# Altium integrated library MOTHER_BOARD_LS1021_v1.0.IntLib: 147 symbols (continued)
## LS1021A (continued)
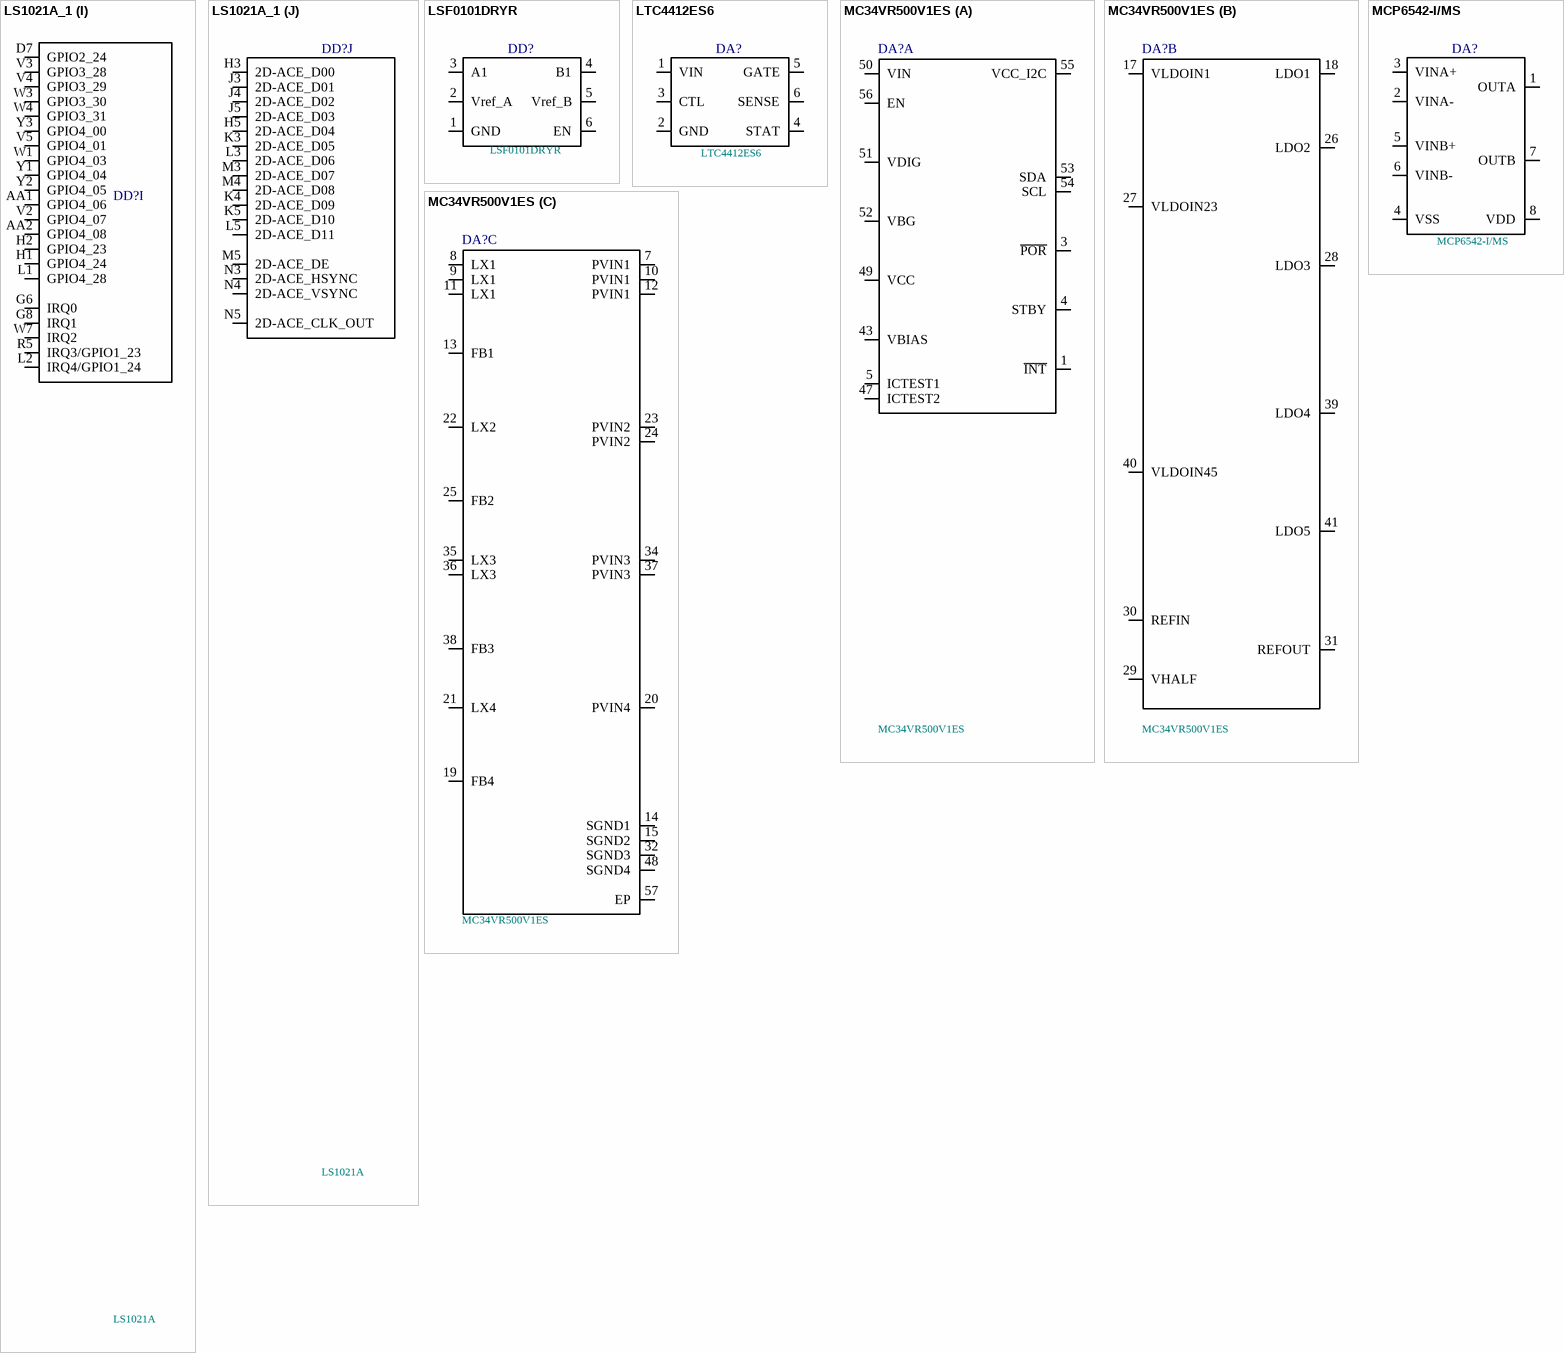
[diagram p6: symbols LS1021A_1 to MCP6542-I/MS]

## LS1021A_1
designator DD?, comment LS1021A
Микросхема LS1021AXE7KQB; Manufactory: NXP Semiconductor; Function: QorIQ® Layerscape 1021A Dual-Core Communications Processor with LCD Controller
footprint BGA525
part A pins: A19 DDR_ECC1, A20 #DDR_MDQS8, A21 DDR_MDQS8, AA18 DDR_A12, AA19 DDR_A10, AA20 DDR_A4, AA21 DDR_BA1, AA22 DDR_CK0, AA23 #DDR_CK0, AB19 DDR_BA2, AB21 DDR_A6, AC18 #DDR_RAS, AC19 DDR_A14, AC20 DDR_A3, AC21 DDR_BA0, AC22 DDR_A0, B19 DDR_ECC0, B21 DDR_DM8, B22 DDR_ECC3, B23 DDR_DQ20, C20 DDR_DQ28, C21 DDR_ECC2, C23 DDR_DQ16, D19 DDR_DQ24, D21 DDR_DQ29, D22 DDR_DQ21, D23 DDR_DQ17, E20 DDR_DQ25, E21 DDR_DM3, E23 DDR_DM2, F21 #DDR_MDQS3, F22 #DDR_MDQS2, F23 DDR_MDQS2, G20 DDR_DQ30, G21 DDR_MDQS3, G23 DDR_DQ22, H18 DDR_CLK, H21 DDR_DQ26, H22 DDR_DQ18, H23 DDR_DQ23, J20 DDR_DQ31, J21 DDR_DQ27, J23 DDR_DQ19, K19 DDR_DQ12, K21 DDR_DQ8, K22 DDR_DQ4, K23 DDR_DQ0, L17 DDR_MVREF, L19 DDR_DQ13, L20 DDR_DM1, L21 DDR_DQ9, L23 DDR_DQ5, M19 DDR_MDQS1, M20 #DDR_MDQS1, M22 DDR_DQ1, M23 DDR_DM0, N17 DDR_TPA, N19 DDR_DQ15, N20 DDR_DQ14, N21 DDR_DQ10, N22 #DDR_MDQS0, N23 DDR_MDQS0, P21 DDR_DQ11, P23 DDR_DQ6, R18 DDR_A15, R19 DDR_ODT1, R20 DDR_ODT0, R22 DDR_DQ7, R23 DDR_DQ2, T18 #DDR_CS1, T20 DDR_A8, T21 DDR_A13, T23 DDR_DQ3, U17 #DDR_CS3, U18 DDR_CKE1, U19 #DDR_CS0, U20 DDR_A7, U21 DDR_A11, U22 DDR_APAR_OUT, V17 #DDR_CS2, V19 DDR_CKE0, V21 DDR_A2, V23 DDR_DIC0, W18 #DDR_CAS, W19 #DDR_WE, W20 DDR_A5, W21 #DDR_APAR_ERR, W22 DDR_CK1, W23 #DDR_CK1, Y19 DDR_A1, Y21 DDR_A9, Y23 DDR_DIC1
part B pins: AA4 EC1_GTX_CLK125, AA5 EC1_TXD2, AA6 EC1_TXD0, AB2 MDC, AB3 MDIO, AB4 EC1_RXD3, AB6 EC1_RXD0, AC3 EC1_RX_CLK, AC4 EC1_RXD2, AC5 EC1_RXD1, AC6 EC1_RX_DV, W5 EC1_TXD3, W6 EC1_TX_EN, Y6 EC1_TXD1, Y7 EC1_GTX_CLK
part C pins: A3 GND, A5 GND, A18 GND, A22 GND, AA3 GND, AA7 S1GND, AA8 S1GND, AA9 S1GND, AA10 S1GND, AA11 S1GND, AA12 S1GND, AA13 S1GND, AA14 S1GND, AA15 S1GND, AA16 S1GND, AA17 S1GND, AB1 GND, AB5 GND, AB7 S1GND, AB9 S1GND, AB12 S1GND, AB15 S1GND, AB17 S1GND, AC2 GND, AC7 S1GND, AC9 S1GND, AC12 S1GND, AC15 S1GND, AC17 S1GND, B1 GND, B3 GND, B5 GND, B7 GND, B10 GND, B13 GND, B16 GND, B18 GND, B20 GND, C2 GND, C4 GND, C19 GND, C22 GND, D2 GND, D6 GND, D18 GND, D20 GND, E4 GND, E9 GND, E12 GND, E15 GND, E19 GND, E22 GND, F17 GND, F20 GND, G2 GND, G7 GND, G19 GND, G22 GND, H4 GND, H6 GND, H8 GND, H9 GND, H10 GND, H11 GND, H12 GND, H13 GND, H14 GND, H15 GND, H17 GND, H20 GND, J16 GND, J18 GND, J19 GND, J22 GND, K2 GND, K7 GND, K9 GND, K10 GND, K13 GND, K16 GND, K18 GND, K20 GND, L4 GND, L7 GND, L10 GND, L12 GND, L14 GND, L16 GND, L18 GND, L22 GND, M7 GND, M9 GND, M11 GND, M13 GND, M16 GND, M17 GND, M18 GND, M21 GND, N2 GND, N7 GND, N10 GND, N12 GND, N14 GND, N16 GND, N18 GND, P4 GND, P7 GND, P9 GND, P11 GND, P13 GND, P16 GND, P18 GND, P20 GND, P22 GND, R7 GND, R10 GND, R14 GND, R16 GND, R17 GND, T2 GND, T7 GND, T9 S1GND, T11 S1GND, T12 S1GND, T13 S1GND, T15 S1GND, T16 GND, T22 GND, U4 GND, U8 GND, U12 S1GND, U23 GND, V6 GND, V10 X1GND, V11 X1GND, V13 X1GND, V14 X1GND, W2 GND, W9 X1GND, W12 X1GND, W15 X1GND, Y5 GND, Y9 X1GND, Y12 X1GND, Y15 X1GND, Y17 GND
part D pins: AB18 G1VDD, AB20 G1VDD, AB22 G1VDD, D4 USB_HVDD, F10 PROG_MTR, F11 TA_PROG_SFP, G10 AVDD_PLAT, G11 AVDD_CGA1, G12 FA_VL, G15 TH_VDD, G16 SENSEGND, H7 USB1_SDVDD, H16 SENSEVDD, J8 USB1_SXVDD, J9 USB1_SPVDD, J10 O1VDD, J11 O1VDD, J12 OVDD, J13 BVDD, J14 BVDD, J15 BVDD, K8 EVDD, K11 VDDC, K12 VDD, K14 VDD, K15 G1VDD, K17 AVDD_D1, L8 DVDD, L9 DVDD, L11 VDD, L13 VDD, L15 G1VDD, M8 D1VDD, M10 VDDC, M12 VDD, M14 VDD, M15 G1VDD, N8 LVDD, N9 VDD, N11 VDD, N13 VDD, N15 G1VDD, P8 LVDD, P10 VDDC, P12 VDD, P14 VDD, P15 G1VDD, P17 G1VDD, P19 G1VDD, R8 L1VDD, R9 VDDC, R11 S1VDD, R12 S1VDD, R13 S1VDD, R15 G1VDD, R21 G1VDD, T6 TA_BB_VDD, T8 L1VDD, T17 G1VDD, T19 G1VDD, U7 SENSEGNDC, U10 AGND_SD1_PLL1, U11 AVDD_SD1_PLL1, U13 AGND_SD1_PLL2, U14 AVDD_SD1_PLL2, V8 SENSEVDDC, V9 X1VDD, V12 X1VDD, V15 X1VDD, V18 G1VDD, V20 G1VDD, V22 G1VDD, Y8 X1VDD, Y18 G1VDD, Y20 G1VDD, Y22 G1VDD
part E pins: A6 EVT2, AB8 SD1_REF_CLK1_N, AB16 SD1_REF_CLK2_N, AC8 SD1_REF_CLK1_P, AC16 SD1_REF_CLK2_P, B6 EVT3, C5 EVT0, C6 CLK_OUT, C7 EVT4, D5 EVT1, E5 HRESET_B, E6 ASLEEP, E7 TDI, E8 TCK, E10 RTC, E11 ~{CKSTP_OUT}, F3 TEST_SEL_B, F4 DIFF_SYSCLK, F5 SYSCLK, F6 ~{TRST}, F7 TDO, F8 TMS, F9 TA_TMP_DETECT_B, F12 FA_ANALOG_PIN, G3 SCAN_MODE_B, G4 nDIFF_SYSCLK, G5 RESET_REQ_B, G9 PORESET_B, G13 FA_ANALOG_G_V, G17 TH_TPA, J6 TD1_ANODE, K6 TD1_CATHODE, R6 TA_BB_RTC, U6 TA_BB_TMP_DETECT_B
part F pins: A2 USB1_TX_M, A4 USB1_RX_M, B2 USB1_TX_P, B4 USB1_RX_P, C1 USB1_VBUS, C3 USB1_D_M, D3 USB1_D_P, E3 USB1_ID, J1 USB1_PWRFAULT, J2 USB1_DRVVBUS, J7 USB1_RESREF, M1 UART1_SIN, M2 IRQ5, N1 UART1_SOUT, N6 I2C1_SCL, P1 UART2_SOUT, P2 UART2_SIN, P3 UART4_SOUT, P5 UART4_SIN, P6 I2C1_SDA, R1 USB2_DIR, R2 USB2_D3, R3 USB2_D6, R4 USB2_D7, T1 USB2_D2, T3 USB2_D4, T4 USB2_D5, T5 USB2_STP, U1 USB2_D1, U2 USB2_D0, U3 USB2_CLK, U5 USB2_PWRFAULT, V1 USB2_NXT, Y4 USB2_DRVVBUS
part G pins: A7 IFC_AD0, A8 IFC_AD2, A9 IFC_AD4, A10 IFC_AD5, A11 IFC_AD7, A12 IFC_AD9, A13 IFC_AD10, A14 IFC_AD12, A15 IFC_AD14, A16 IFC_AD15, A17 IFC_CLK0, B8 IFC_AD1, B9 IFC_AD3, B11 IFC_AD6, B12 IFC_AD8, B14 IFC_AD11, B15 IFC_AD13, B17 IFC_CLK1, C8 IFC_A16, C9 IFC_A18, C10 IFC_A20, C11 IFC_A22, C12 IFC_A24, C13 IFC_A26, C14 IFC_NDDDR_CLK, C15 ~{IFC_PERR}, C16 IFC_AVD, C17 ~{IFC_CS0}, C18 ~{IFC_CS2}, D1 SDHC_CLK, D8 IFC_A17, D9 IFC_A19, D10 IFC_A21, D11 IFC_A23, D12 IFC_A25, D13 IFC_A27, D14 IFC_TE, D15 IFC_PAR0, D16 IFC_NDDQS, D17 ~{IFC_CS1}, E1 SDHC_DAT0, E2 SDHC_CMD, E13 IFC_PAR1, E14 IFC_BCTL, E16 ~{IFC_OE}, E17 IFC_CLE, E18 ~{IFC_WP0}, F1 SDHC_DAT2, F2 SDHC_DAT1, F14 ~{IFC_WE0}, F15 ~{IFC_RB1}, F16 ~{IFC_RB0}, F18 ~{IFC_CS3}, G1 SDHC_DAT3, K1 SDHC_CD
part H pins: AB10 SD1_RX0_N, AB11 SD1_RX1_N, AB13 SD1_RX2_N, AB14 SD1_RX3_N, AC10 SD1_RX0_P, AC11 SD1_RX1_P, AC13 SD1_RX2_P, AC14 SD1_RX3_P, T10 SD1_PLL1_TPA, T14 SD1_IMP_CAL_TX, U9 SD1_IMP_CAL_RX, U15 SD1_PLL2_TPA, W8 SD1_PLL1_TPD, W10 SD1_TX0_P, W11 SD1_TX1_P, W13 SD1_TX2_P, W14 SD1_TX3_P, Y10 SD1_TX0_N, Y11 SD1_TX1_N, Y13 SD1_TX2_N, Y14 SD1_TX3_N, Y16 SD1_PLL2_TPD
part I pins: AA1 GPIO4_06, AA2 GPIO4_08, D7 GPIO2_24, G6 IRQ0, G8 IRQ1, H1 GPIO4_24, H2 GPIO4_23, L1 GPIO4_28, L2 IRQ4/GPIO1_24, R5 IRQ3/GPIO1_23, V2 GPIO4_07, V3 GPIO3_28, V4 GPIO3_29, V5 GPIO4_01, W1 GPIO4_03, W3 GPIO3_30, W4 GPIO3_31, W7 IRQ2, Y1 GPIO4_04, Y2 GPIO4_05, Y3 GPIO4_00
part J pins: H3 2D-ACE_D00, H5 2D-ACE_D04, J3 2D-ACE_D01, J4 2D-ACE_D02, J5 2D-ACE_D03, K3 2D-ACE_D05, K4 2D-ACE_D09, K5 2D-ACE_D10, L3 2D-ACE_D06, L5 2D-ACE_D11, M3 2D-ACE_D07, M4 2D-ACE_D08, M5 2D-ACE_DE, N3 2D-ACE_HSYNC, N4 2D-ACE_VSYNC, N5 2D-ACE_CLK_OUT

## LSF0101DRYR
designator DD?
Микросхема LSF0101DRYR; Manufactory: Texas Instruments; Function: Single bi-directional multi-voltage level translator
footprint SON-6 (Footprint not found)
pins: 1 GND, 2 Vref_A, 3 A1, 4 B1, 5 Vref_B, 6 EN

## LTC4412ES6
designator DA?
Микросхема LTC4412ES6; Manufactory: Analog Devices; Function: Low Loss PowerPath Controller
footprint SOT-23-6
pins: 1 VIN, 2 GND, 3 CTL, 4 STAT, 5 GATE, 6 SENSE

## MC34VR500V1ES
designator DA?
Микросхема MC34VR500V1ES; Manufactory: NXP Semiconductors; Function: Multi-output DC/DC regulator for  QorIQ LS1/T1 family
footprint QFN-56 (QFN, 56-Leads, Body 8,00x8,00mm, Pitch 0,50mm, Thermal Pad 5,90x5,90mm, IPC Medium Density)
part A pins: 1 ~{INT}, 3 ~{POR}, 4 STBY, 5 ICTEST1, 43 VBIAS, 47 ICTEST2, 49 VCC, 50 VIN, 51 VDIG, 52 VBG, 53 SDA, 54 SCL, 55 VCC_I2C, 56 EN
part B pins: 17 VLDOIN1, 18 LDO1, 26 LDO2, 27 VLDOIN23, 28 LDO3, 29 VHALF, 30 REFIN, 31 REFOUT, 39 LDO4, 40 VLDOIN45, 41 LDO5
part C pins: 7 PVIN1, 8 LX1, 9 LX1, 10 PVIN1, 11 LX1, 12 PVIN1, 13 FB1, 14 SGND1, 15 SGND2, 19 FB4, 20 PVIN4, 21 LX4, 22 LX2, 23 PVIN2, 24 PVIN2, 25 FB2, 32 SGND3, 34 PVIN3, 35 LX3, 36 LX3, 37 PVIN3, 38 FB3, 48 SGND4, 57 EP

## MCP6542-I/MS
designator DA?
Микросхема MCP6542-I/MS; Manufactory: Microchip Technology; Function: Dual channels comparator
footprint SOIC8
pins: 1 OUTA, 2 VINA-, 3 VINA+, 4 VSS, 5 VINB+, 6 VINB-, 7 OUTB, 8 VDD

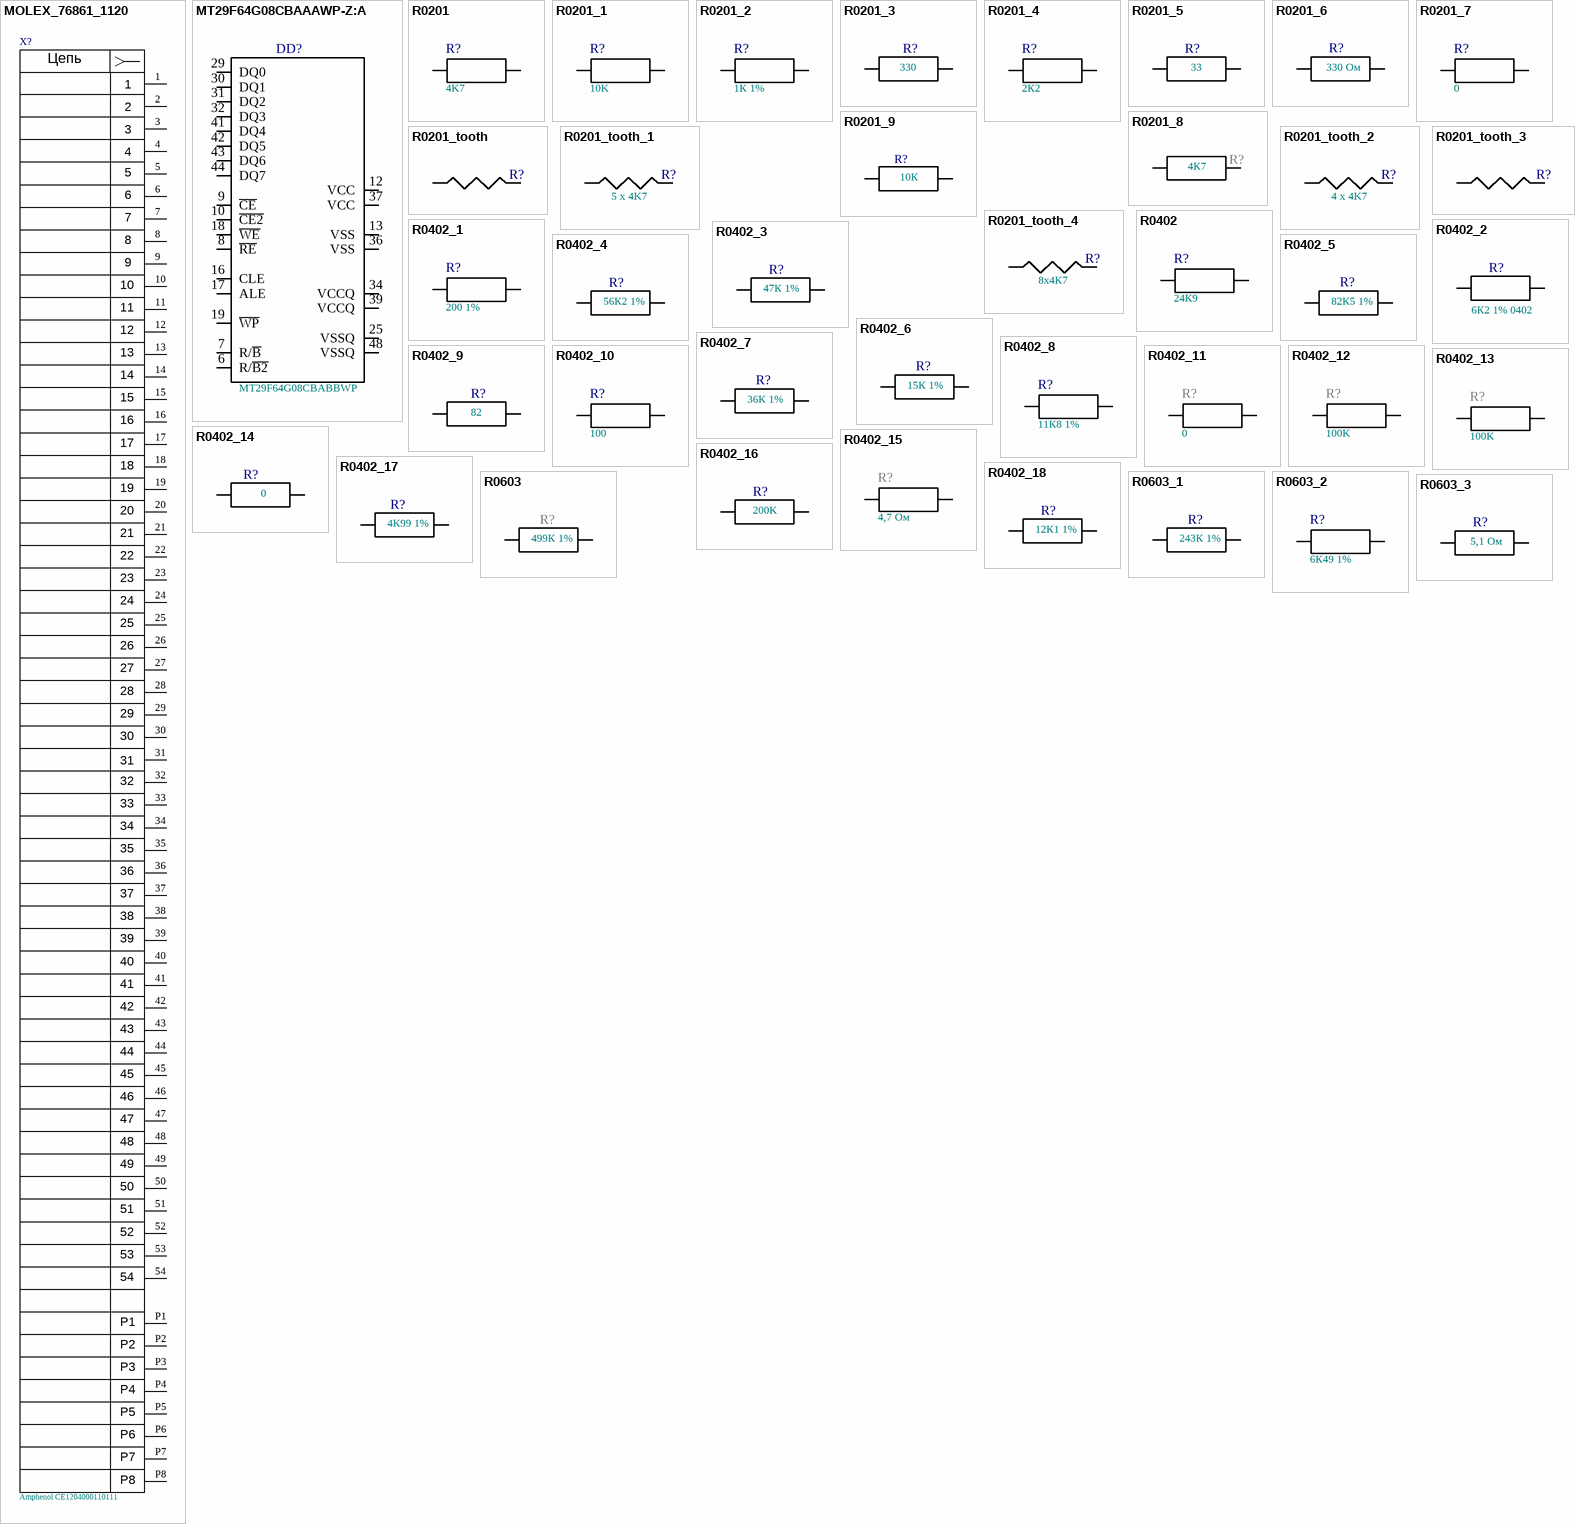
[diagram p7: symbols MOLEX_76861_1120 to R0603_3]

## MOLEX_76861_1120
designator X?, comment Amphenol CE1204000110111
Разъём Amphenol CE1204000110111
footprint CE1204000110111
pins: 1, 2, 3, 4, 5, 6, 7, 8, 9, 10, 11, 12, 13, 14, 15, 16, 17, 18, 19, 20, 21, 22, 23, 24, 25, 26, 27, 28, 29, 30, 31, 32, 33, 34, 35, 36, 37, 38, 39, 40, 41, 42, 43, 44, 45, 46, 47, 48, 49, 50, 51, 52, 53, 54, P1, P2, P3, P4, P5, P6, P7, P8
text: Цепь

## MT29F64G08CBAAAWP-Z:A
designator DD?, comment MT29F64G08CBABBWP
Микросхема MT29F64G08CBABBWP-12IT:B; Manufactory: Micron Technology; Function: Память MLC NAND-flash 64 Гбит
footprint TSOP-48 (TSSOP, 48-Leads, Body 12,00x18,40mm, Pitch 0,50mm, IPC Medium Density)
pins: 6 R/~{B2}, 7 R/~{B}, 8 ~{RE}, 9 ~{CE}, 10 ~{CE2}, 12 VCC, 13 VSS, 16 CLE, 17 ALE, 18 ~{WE}, 19 ~{WP}, 25 VSSQ, 29 DQ0, 30 DQ1, 31 DQ2, 32 DQ3, 34 VCCQ, 36 VSS, 37 VCC, 39 VCCQ, 41 DQ4, 42 DQ5, 43 DQ6, 44 DQ7, 48 VSSQ

## R0201
designator R?, comment 4K7
Чип-резистор 4,7 кОм 5% 0201; TYPE: Чип-резистор 0201
footprint R0201
pins: 1, 2

## R0201_1
designator R?, comment 10K
Чип-резистор 10 кОм 5% 0201; TYPE: Чип-резистор 0201
footprint R0201
pins: 1, 2

## R0201_2
designator R?, comment 1К 1%
Чип-резистор 1 кОм 1% 0201; TYPE: Чип-резистор 0201
footprint R0201
pins: 1, 2

## R0201_3
designator R?, comment 330
Чип-резистор 330 Ом 5% 0201; TYPE: Чип-резистор 0201
footprint R0201
pins: 1, 2

## R0201_4
designator R?, comment 2К2
Чип-резистор 2,2 кОм 5% 0201; TYPE: Чип-резистор 0201
footprint R0201
pins: 1, 2

## R0201_5
designator R?, comment 33
Чип-резистор 33  Ом 5% 0201; TYPE: Чип-резистор 0201
footprint R0201
pins: 1, 2

## R0201_6
designator R?, comment 330 Ом
Чип-резистор 330 Ом 5% 0201; TYPE: Чип-резистор 0201
footprint R0201
pins: 1, 2

## R0201_7
designator R?, comment 0
Чип-резистор 0,00 Ом 5% 0201; TYPE: Чип-резистор 0201
footprint R0201
pins: 1, 2

## R0201_8
designator R?, comment 4К7  (no BOM)
Чип-резистор 4,7 кОм 5% 0201; TYPE: Чип-резистор 0201
footprint R0201
footprint R0201
pins: 1, 2

## R0201_9
designator R?, comment 10К
Чип-резистор 10 кОм 5% 0201; TYPE: Чип-резистор 0201
footprint R0201
pins: 1, 2

## R0201_tooth
designator R?, comment 4K7  (value not drawn)
Чип-резистор 4,7 кОм 5% 0201; TYPE: Чип-резистор 0201
footprint R0201
pins: 1, 2

## R0201_tooth_1
designator R?, comment 5 x 4K7
Чип-резистор 4,7 кОм 5% 0201; TYPE: Чип-резистор 0201
footprint R0201
pins: 1, 2

## R0201_tooth_2
designator R?, comment 4 x 4K7
Чип-резистор 4,7 кОм 5% 0201; TYPE: Чип-резистор 0201
footprint R0201
pins: 1, 2

## R0201_tooth_3
designator R?, comment 4К7  (value not drawn)
Чип-резистор 4,7 кОм 5% 0201; TYPE: Чип-резистор 0201
footprint R0201
footprint R0201
pins: 1, 2

## R0201_tooth_4
designator R?, comment 8х4К7
Чип-резистор 4,7 кОм 5% 0201; TYPE: Чип-резистор 0201
footprint R0201
pins: 1, 2

## R0402
designator R?, comment 24К9
Чип-резистор 24,9 кОм 1% 0402; TYPE: Чип-резистор 0402
footprint R0402
pins: 1, 2

## R0402_1
designator R?, comment 200 1%
Чип-резистор 200 Ом 1% 0402; TYPE: Чип-резистор 0402
footprint R0402 (Р1-12-0,062)
pins: 1, 2

## R0402_2
designator R?, comment 6К2 1% 0402
Чип-резистор 6,2 кОм 1% 0402; TYPE: Чип-резистор 0402
footprint R0402
pins: 1, 2

## R0402_3
designator R?, comment 47К 1%
Чип-резистор 47 кОм 1% 0402; TYPE: Чип-резистор 0402
footprint R0402
pins: 1, 2

## R0402_4
designator R?, comment 56К2 1%
Чип-резистор 56,2 кОм 1% 0402; TYPE: Чип-резистор 0402
footprint R0402
pins: 1, 2

## R0402_5
designator R?, comment 82К5 1%
Чип-резистор 82,5 кОм 1% 0402; TYPE: Чип-резистор 0402
footprint R0402
pins: 1, 2

## R0402_6
designator R?, comment 15К 1%
Чип-резистор 15 кОм 1% 0402; TYPE: Чип-резистор 0402
footprint R0402
pins: 1, 2

## R0402_7
designator R?, comment 36К 1%
Чип-резистор 36 кОм 1% 0402; TYPE: Чип-резистор 0402
footprint R0402
pins: 1, 2

## R0402_8
designator R?, comment 11К8 1%
Чип-резистор 11,8 кОм 1% 0402; TYPE: Чип-резистор 0402
footprint R0402
pins: 1, 2

## R0402_9
designator R?, comment 82
Чип-резистор 82 Ом 5% 0402; TYPE: Чип-резистор 0402
footprint R0402
pins: 1, 2

## R0402_10
designator R?, comment 100
Чип-резистор 100 Ом 5% 0402; TYPE: Чип-резистор 0402
footprint R0402
pins: 1, 2

## R0402_11
designator R?, comment 0  (no BOM)
Чип-резистор 0 Ом 0402; TYPE: Чип-резистор 0402
footprint R0402
pins: 1, 2

## R0402_12
designator R?, comment 100K  (no BOM)
Чип-резистор 100 кОм 5% 0402; VALUE: 100 кОм 0402; TYPE: Чип-резистор 0402
footprint R0402
pins: 1, 2

## R0402_13
designator R?, comment 100K  (no BOM)
Чип-резистор 100 кОм 5% 0402; TYPE: Чип-резистор 0402
footprint R0402 (Р1-12-0,062)
footprint R0402 (Р1-12-0,062)
pins: 1, 2

## R0402_14
designator R?, comment 0
Чип-резистор 0 Ом 5% 0402; VALUE: Резистор чип 4,7 Ом 5% 0402; TYPE: Резистор чип 4,7 Ом 5% 0402
footprint R0402
pins: 1, 2
